# Altium schematic symbol library Resistor - Current Sense.SchLib: 810 symbols (part 2 of 4)
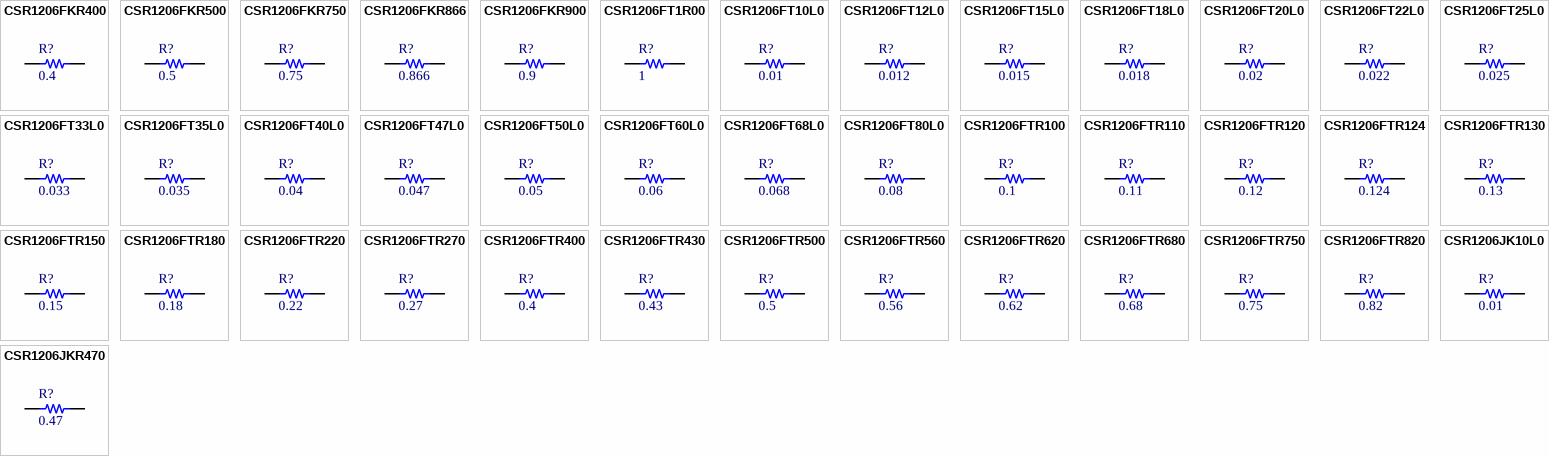
[diagram p21: symbols CSR1206FKR400 to CSR1206JKR470]

## CSR1206FTR500
designator R?, comment 0.5
RES SMD 0.5 OHM 1% 1/2W 1206; Part Number: CSR1206FTR500; Manufacturer: Stackpole Electronics Inc.; TemperatureRange: -55C ~ 155C; TemperatureCoefficient: 100ppm/C; PowerRating: 0.5W, 1/2W; Value: 0.5; PartId: 9976; Supplier 1: Digi-Key; Supplier Part Number 1: CSR1206FTR500TR-ND; ComponentLink1Description: Datasheet; ComponentLink1URL: http://www.seielect.com/catalog/SEI-CSR_CSRN.pdf; ComponentLink2Description: Digi-Key Listing; ComponentLink2URL: https://www.digikey.com/product-detail/en/stackpole-electronics-inc/CSR1206FTR500/CSR1206FTR500TR-ND/1742401; Tolerance: 1%; Price: 0.0427; Device Package: 1206 (3216 Metric)
footprint STACKPOLE CSR1206
pins: 1, 2

## CSR1206FTR560
designator R?, comment 0.56
RES SMD 0.56 OHM 1% 1/2W 1206; Part Number: CSR1206FTR560; Manufacturer: Stackpole Electronics Inc.; TemperatureRange: -55C ~ 155C; TemperatureCoefficient: 100ppm/C; PowerRating: 0.5W, 1/2W; Value: 0.56; PartId: 9979; Supplier 1: Digi-Key; Supplier Part Number 1: CSR1206FTR560-ND; ComponentLink1Description: Datasheet; ComponentLink1URL: http://www.seielect.com/catalog/SEI-CSR_CSRN.pdf; ComponentLink2Description: Digi-Key Listing; ComponentLink2URL: https://www.digikey.com/product-detail/en/stackpole-electronics-inc/CSR1206FTR560/CSR1206FTR560-ND/1742403; Tolerance: 1%; Price: 0.0427; Device Package: 1206 (3216 Metric)
footprint STACKPOLE CSR1206
pins: 1, 2

## CSR1206FTR620
designator R?, comment 0.62
RES SMD 0.62 OHM 1% 1/2W 1206; Part Number: CSR1206FTR620; Manufacturer: Stackpole Electronics Inc.; TemperatureRange: -55C ~ 155C; TemperatureCoefficient: 100ppm/C; PowerRating: 0.5W, 1/2W; Value: 0.62; PartId: 9980; Supplier 1: Digi-Key; Supplier Part Number 1: CSR1206FTR620-ND; ComponentLink1Description: Datasheet; ComponentLink1URL: http://www.seielect.com/catalog/SEI-CSR_CSRN.pdf; ComponentLink2Description: Digi-Key Listing; ComponentLink2URL: https://www.digikey.com/product-detail/en/stackpole-electronics-inc/CSR1206FTR620/CSR1206FTR620-ND/1742404; Tolerance: 1%; Price: 0.0427; Device Package: 1206 (3216 Metric)
footprint STACKPOLE CSR1206
pins: 1, 2

## CSR1206FTR680
designator R?, comment 0.68
RES SMD 0.68 OHM 1% 1/2W 1206; Part Number: CSR1206FTR680; Manufacturer: Stackpole Electronics Inc.; TemperatureRange: -55C ~ 155C; TemperatureCoefficient: 100ppm/C; PowerRating: 0.5W, 1/2W; Value: 0.68; PartId: 9981; Supplier 1: Digi-Key; Supplier Part Number 1: CSR1206FTR680-ND; ComponentLink1Description: Datasheet; ComponentLink1URL: http://www.seielect.com/catalog/SEI-CSR_CSRN.pdf; ComponentLink2Description: Digi-Key Listing; ComponentLink2URL: https://www.digikey.com/product-detail/en/stackpole-electronics-inc/CSR1206FTR680/CSR1206FTR680-ND/1742405; Tolerance: 1%; Price: 0.0427; Device Package: 1206 (3216 Metric)
footprint STACKPOLE CSR1206
pins: 1, 2

## CSR1206FTR750
designator R?, comment 0.75
RES SMD 0.75 OHM 1% 1/2W 1206; Part Number: CSR1206FTR750; Manufacturer: Stackpole Electronics Inc.; TemperatureRange: -55C ~ 155C; TemperatureCoefficient: 100ppm/C; PowerRating: 0.5W, 1/2W; Value: 0.75; PartId: 9983; Supplier 1: Digi-Key; Supplier Part Number 1: CSR1206FTR750-ND; ComponentLink1Description: Datasheet; ComponentLink1URL: http://www.seielect.com/catalog/SEI-CSR_CSRN.pdf; ComponentLink2Description: Digi-Key Listing; ComponentLink2URL: https://www.digikey.com/product-detail/en/stackpole-electronics-inc/CSR1206FTR750/CSR1206FTR750-ND/1742406; Tolerance: 1%; Price: 0.0427; Device Package: 1206 (3216 Metric)
footprint STACKPOLE CSR1206
pins: 1, 2

## CSR1206FTR820
designator R?, comment 0.82
RES SMD 0.82 OHM 1% 1/2W 1206; Part Number: CSR1206FTR820; Manufacturer: Stackpole Electronics Inc.; TemperatureRange: -55C ~ 155C; TemperatureCoefficient: 100ppm/C; PowerRating: 0.5W, 1/2W; Value: 0.82; PartId: 9984; Supplier 1: Digi-Key; Supplier Part Number 1: CSR1206FTR820TR-ND; ComponentLink1Description: Datasheet; ComponentLink1URL: http://www.seielect.com/catalog/SEI-CSR_CSRN.pdf; ComponentLink2Description: Digi-Key Listing; ComponentLink2URL: https://www.digikey.com/product-detail/en/stackpole-electronics-inc/CSR1206FTR820/CSR1206FTR820TR-ND/1742407; Tolerance: 1%; Price: 0.0427; Device Package: 1206 (3216 Metric)
footprint STACKPOLE CSR1206
pins: 1, 2

## CSR1206JK10L0
designator R?, comment 0.01
RES SMD 0.01 OHM 5% 1/2W 1206; Part Number: CSR1206JK10L0; Manufacturer: Stackpole Electronics Inc.; TemperatureRange: -55C ~ 155C; PowerRating: 0.5W, 1/2W; Value: 0.01; PartId: 9925; Supplier 1: Digi-Key; Supplier Part Number 1: CSR1206JK10L0-ND; ComponentLink1Description: Datasheet; ComponentLink1URL: http://www.seielect.com/catalog/SEI-CSR_CSRN.pdf; ComponentLink2Description: Digi-Key Listing; ComponentLink2URL: https://www.digikey.com/product-detail/en/stackpole-electronics-inc/CSR1206JK10L0/CSR1206JK10L0-ND/1742358; Tolerance: 5%; Price: 0.126; Device Package: 1206 (3216 Metric)
footprint STACKPOLE CSR1206
pins: 1, 2

## CSR1206JKR470
designator R?, comment 0.47
RES SMD 0.47 OHM 5% 1/2W 1206; Part Number: CSR1206JKR470; Manufacturer: Stackpole Electronics Inc.; TemperatureRange: -55C ~ 155C; TemperatureCoefficient: 100ppm/C; PowerRating: 0.5W, 1/2W; Value: 0.47; PartId: 9975; Supplier 1: Digi-Key; Supplier Part Number 1: CSR1206JKR470-ND; ComponentLink1Description: Datasheet; ComponentLink1URL: http://www.seielect.com/catalog/SEI-CSR_CSRN.pdf; ComponentLink2Description: Digi-Key Listing; ComponentLink2URL: https://www.digikey.com/product-detail/en/stackpole-electronics-inc/CSR1206JKR470/CSR1206JKR470-ND/1742400; Tolerance: 5%; Price: 0.051; Device Package: 1206 (3216 Metric)
footprint STACKPOLE CSR1206
pins: 1, 2

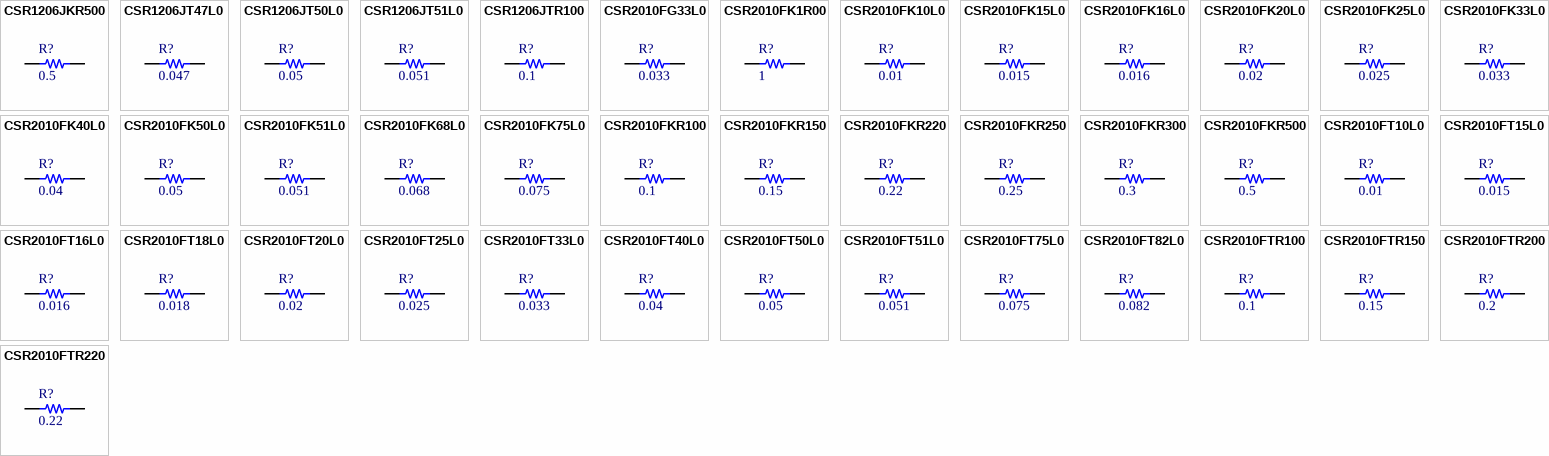
[diagram p5: symbols CSR1206JKR500 to CSR2010FTR220]

## CSR1206JKR500
designator R?, comment 0.5
RES SMD 0.5 OHM 5% 1/2W 1206; Part Number: CSR1206JKR500; Manufacturer: Stackpole Electronics Inc.; TemperatureRange: -55C ~ 155C; TemperatureCoefficient: 100ppm/C; PowerRating: 0.5W, 1/2W; Value: 0.5; PartId: 9978; Supplier 1: Digi-Key; Supplier Part Number 1: CSR1206JKR500-ND; ComponentLink1Description: Datasheet; ComponentLink1URL: http://www.seielect.com/catalog/SEI-CSR_CSRN.pdf; ComponentLink2Description: Digi-Key Listing; ComponentLink2URL: https://www.digikey.com/product-detail/en/stackpole-electronics-inc/CSR1206JKR500/CSR1206JKR500-ND/1742402; Tolerance: 5%; Price: 0.027; Device Package: 1206 (3216 Metric)
footprint STACKPOLE CSR1206
pins: 1, 2

## CSR1206JT47L0
designator R?, comment 0.047
RES SMD 0.047 OHM 5% 1/2W 1206; Part Number: CSR1206JT47L0; Manufacturer: Stackpole Electronics Inc.; TemperatureRange: -55C ~ 155C; PowerRating: 0.5W, 1/2W; Value: 0.047; PartId: 9942; Supplier 1: Digi-Key; Supplier Part Number 1: CSR1206JT47L0-ND; ComponentLink1Description: Datasheet; ComponentLink1URL: http://www.seielect.com/catalog/SEI-CSR_CSRN.pdf; ComponentLink2Description: Digi-Key Listing; ComponentLink2URL: https://www.digikey.com/product-detail/en/stackpole-electronics-inc/CSR1206JT47L0/CSR1206JT47L0-ND/1742371; Tolerance: 5%; Price: 0.0931; Device Package: 1206 (3216 Metric)
footprint STACKPOLE CSR1206
pins: 1, 2

## CSR1206JT50L0
designator R?, comment 0.05
RES SMD 0.05 OHM 5% 1/2W 1206; Part Number: CSR1206JT50L0; Manufacturer: Stackpole Electronics Inc.; TemperatureRange: -55C ~ 155C; TemperatureCoefficient: 100ppm/C; PowerRating: 0.5W, 1/2W; Value: 0.05; PartId: 9945; Supplier 1: Digi-Key; Supplier Part Number 1: CSR1206JT50L0-ND; ComponentLink1Description: Datasheet; ComponentLink1URL: http://www.seielect.com/catalog/SEI-CSR_CSRN.pdf; ComponentLink2Description: Digi-Key Listing; ComponentLink2URL: https://www.digikey.com/product-detail/en/stackpole-electronics-inc/CSR1206JT50L0/CSR1206JT50L0-ND/1742373; Tolerance: 5%; Price: 0.0931; Device Package: 1206 (3216 Metric)
footprint STACKPOLE CSR1206
pins: 1, 2

## CSR1206JT51L0
designator R?, comment 0.051
RES SMD 0.051 OHM 5% 1/2W 1206; Part Number: CSR1206JT51L0; Manufacturer: Stackpole Electronics Inc.; TemperatureRange: -55C ~ 155C; TemperatureCoefficient: 100ppm/C; PowerRating: 0.5W, 1/2W; Value: 0.051; PartId: 9946; Supplier 1: Digi-Key; Supplier Part Number 1: CSR1206JT51L0-ND; ComponentLink1Description: Datasheet; ComponentLink1URL: http://www.seielect.com/catalog/SEI-CSR_CSRN.pdf; ComponentLink2Description: Digi-Key Listing; ComponentLink2URL: https://www.digikey.com/product-detail/en/stackpole-electronics-inc/CSR1206JT51L0/CSR1206JT51L0-ND/1742374; Tolerance: 5%; Price: 0.081; Device Package: 1206 (3216 Metric)
footprint STACKPOLE CSR1206
pins: 1, 2

## CSR1206JTR100
designator R?, comment 0.1
RES SMD 0.1 OHM 5% 1/2W 1206; Part Number: CSR1206JTR100; Manufacturer: Stackpole Electronics Inc.; TemperatureRange: -55C ~ 155C; TemperatureCoefficient: 100ppm/C; PowerRating: 0.5W, 1/2W; Value: 0.1; PartId: 9954; Supplier 1: Digi-Key; Supplier Part Number 1: CSR1206JTR100-ND; ComponentLink1Description: Datasheet; ComponentLink1URL: http://www.seielect.com/catalog/SEI-CSR_CSRN.pdf; ComponentLink2Description: Digi-Key Listing; ComponentLink2URL: https://www.digikey.com/product-detail/en/stackpole-electronics-inc/CSR1206JTR100/CSR1206JTR100-ND/1742380; Tolerance: 5%; Price: 0.0427; Device Package: 1206 (3216 Metric)
footprint STACKPOLE CSR1206
pins: 1, 2

## CSR2010FG33L0
designator R?, comment 0.033
RES SMD 0.033 OHM 1% 1W 2010; Part Number: CSR2010FG33L0; Manufacturer: Stackpole Electronics Inc.; TemperatureRange: -55C ~ 155C; Value: 0.033; PartId: 10021; Supplier 1: Digi-Key; Supplier Part Number 1: CSR2010FG33L0TR-ND; ComponentLink1Description: Datasheet; ComponentLink1URL: http://www.seielect.com/catalog/SEI-CSR_CSRN.pdf; ComponentLink2Description: Digi-Key Listing; ComponentLink2URL: https://www.digikey.com/product-detail/en/stackpole-electronics-inc/CSR2010FG33L0/CSR2010FG33L0TR-ND/2027021; Tolerance: 1%; PowerRating: 1W; Price: 0.169; Device Package: 2010 (5025 Metric)
footprint STACKPOLE CSR2010
pins: 1, 2

## CSR2010FK1R00
designator R?, comment 1
RES SMD 1 OHM 1% 1W 2010; Part Number: CSR2010FK1R00; Manufacturer: Stackpole Electronics Inc.; TemperatureRange: -55C ~ 155C; TemperatureCoefficient: 100ppm/C; Value: 1; PartId: 9999; Supplier 1: Digi-Key; Supplier Part Number 1: CSR2010FK1R00-ND; ComponentLink1Description: Datasheet; ComponentLink1URL: http://www.seielect.com/catalog/SEI-CSR_CSRN.pdf; ComponentLink2Description: Digi-Key Listing; ComponentLink2URL: https://www.digikey.com/product-detail/en/stackpole-electronics-inc/CSR2010FK1R00/CSR2010FK1R00-ND/1742356; Tolerance: 1%; PowerRating: 1W; Price: 0.098; Device Package: 2010 (5025 Metric)
footprint STACKPOLE CSR2010
pins: 1, 2

## CSR2010FK10L0
designator R?, comment 0.01
RES SMD 0.01 OHM 1% 1W 2010; Part Number: CSR2010FK10L0; Manufacturer: Stackpole Electronics Inc.; TemperatureRange: -55C ~ 155C; Value: 0.01; PartId: 10035; Supplier 1: Digi-Key; Supplier Part Number 1: CSR2010FK10L0-ND; ComponentLink1Description: Datasheet; ComponentLink1URL: http://www.seielect.com/catalog/SEI-CSR_CSRN.pdf; ComponentLink2Description: Digi-Key Listing; ComponentLink2URL: https://www.digikey.com/product-detail/en/stackpole-electronics-inc/CSR2010FK10L0/CSR2010FK10L0-ND/1742310; Tolerance: 1%; PowerRating: 1W; Price: 0.1925; Device Package: 2010 (5025 Metric)
footprint STACKPOLE CSR2010
pins: 1, 2

## CSR2010FK15L0
designator R?, comment 0.015
RES SMD 0.015 OHM 1% 1W 2010; Part Number: CSR2010FK15L0; Manufacturer: Stackpole Electronics Inc.; TemperatureRange: -55C ~ 155C; Value: 0.015; PartId: 10036; Supplier 1: Digi-Key; Supplier Part Number 1: CSR2010FK15L0-ND; ComponentLink1Description: Datasheet; ComponentLink1URL: http://www.seielect.com/catalog/SEI-CSR_CSRN.pdf; ComponentLink2Description: Digi-Key Listing; ComponentLink2URL: https://www.digikey.com/product-detail/en/stackpole-electronics-inc/CSR2010FK15L0/CSR2010FK15L0-ND/1742313; Tolerance: 1%; PowerRating: 1W; Price: 0.1925; Device Package: 2010 (5025 Metric)
footprint STACKPOLE CSR2010
pins: 1, 2

## CSR2010FK16L0
designator R?, comment 0.016
RES SMD 0.016 OHM 1% 1W 2010; Part Number: CSR2010FK16L0; Manufacturer: Stackpole Electronics Inc.; TemperatureRange: -55C ~ 155C; Value: 0.016; PartId: 10037; Supplier 1: Digi-Key; Supplier Part Number 1: CSR2010FK16L0-ND; ComponentLink1Description: Datasheet; ComponentLink1URL: http://www.seielect.com/catalog/SEI-CSR_CSRN.pdf; ComponentLink2Description: Digi-Key Listing; ComponentLink2URL: https://www.digikey.com/product-detail/en/stackpole-electronics-inc/CSR2010FK16L0/CSR2010FK16L0-ND/1742315; Tolerance: 1%; PowerRating: 1W; Price: 0.1925; Device Package: 2010 (5025 Metric)
footprint STACKPOLE CSR2010
pins: 1, 2

## CSR2010FK20L0
designator R?, comment 0.02
RES SMD 0.02 OHM 1% 1W 2010; Part Number: CSR2010FK20L0; Manufacturer: Stackpole Electronics Inc.; TemperatureRange: -55C ~ 155C; Value: 0.02; PartId: 10038; Supplier 1: Digi-Key; Supplier Part Number 1: CSR2010FK20L0-ND; ComponentLink1Description: Datasheet; ComponentLink1URL: http://www.seielect.com/catalog/SEI-CSR_CSRN.pdf; ComponentLink2Description: Digi-Key Listing; ComponentLink2URL: https://www.digikey.com/product-detail/en/stackpole-electronics-inc/CSR2010FK20L0/CSR2010FK20L0-ND/1742318; Tolerance: 1%; PowerRating: 1W; Price: 0.1925; Device Package: 2010 (5025 Metric)
footprint STACKPOLE CSR2010
pins: 1, 2

## CSR2010FK25L0
designator R?, comment 0.025
RES SMD 0.025 OHM 1% 1W 2010; Part Number: CSR2010FK25L0; Manufacturer: Stackpole Electronics Inc.; TemperatureRange: -55C ~ 155C; Value: 0.025; PartId: 10027; Supplier 1: Digi-Key; Supplier Part Number 1: CSR2010FK25L0-ND; ComponentLink1Description: Datasheet; ComponentLink1URL: http://www.seielect.com/catalog/SEI-CSR_CSRN.pdf; ComponentLink2Description: Digi-Key Listing; ComponentLink2URL: https://www.digikey.com/product-detail/en/stackpole-electronics-inc/CSR2010FK25L0/CSR2010FK25L0-ND/1742320; Tolerance: 1%; PowerRating: 1W; Price: 0.1787; Device Package: 2010 (5025 Metric)
footprint STACKPOLE CSR2010
pins: 1, 2

## CSR2010FK33L0
designator R?, comment 0.033
RES SMD 0.033 OHM 1% 1W 2010; Part Number: CSR2010FK33L0; Manufacturer: Stackpole Electronics Inc.; TemperatureRange: -55C ~ 155C; Value: 0.033; PartId: 10028; Supplier 1: Digi-Key; Supplier Part Number 1: CSR2010FK33L0-ND; ComponentLink1Description: Datasheet; ComponentLink1URL: http://www.seielect.com/catalog/SEI-CSR_CSRN.pdf; ComponentLink2Description: Digi-Key Listing; ComponentLink2URL: https://www.digikey.com/product-detail/en/stackpole-electronics-inc/CSR2010FK33L0/CSR2010FK33L0-ND/1742324; Tolerance: 1%; PowerRating: 1W; Price: 0.1787; Device Package: 2010 (5025 Metric)
footprint STACKPOLE CSR2010
pins: 1, 2

## CSR2010FK40L0
designator R?, comment 0.04
RES SMD 0.04 OHM 1% 1W 2010; Part Number: CSR2010FK40L0; Manufacturer: Stackpole Electronics Inc.; TemperatureRange: -55C ~ 155C; Value: 0.04; PartId: 10029; Supplier 1: Digi-Key; Supplier Part Number 1: CSR2010FK40L0-ND; ComponentLink1Description: Datasheet; ComponentLink1URL: http://www.seielect.com/catalog/SEI-CSR_CSRN.pdf; ComponentLink2Description: Digi-Key Listing; ComponentLink2URL: https://www.digikey.com/product-detail/en/stackpole-electronics-inc/CSR2010FK40L0/CSR2010FK40L0-ND/1742326; Tolerance: 1%; PowerRating: 1W; Price: 0.1787; Device Package: 2010 (5025 Metric)
footprint STACKPOLE CSR2010
pins: 1, 2

## CSR2010FK50L0
designator R?, comment 0.05
RES SMD 0.05 OHM 1% 1W 2010; Part Number: CSR2010FK50L0; Manufacturer: Stackpole Electronics Inc.; TemperatureRange: -55C ~ 155C; TemperatureCoefficient: 100ppm/C; Value: 0.05; PartId: 10030; Supplier 1: Digi-Key; Supplier Part Number 1: CSR2010FK50L0-ND; ComponentLink1Description: Datasheet; ComponentLink1URL: http://www.seielect.com/catalog/SEI-CSR_CSRN.pdf; ComponentLink2Description: Digi-Key Listing; ComponentLink2URL: https://www.digikey.com/product-detail/en/stackpole-electronics-inc/CSR2010FK50L0/CSR2010FK50L0-ND/1742328; Tolerance: 1%; PowerRating: 1W; Price: 0.1787; Device Package: 2010 (5025 Metric)
footprint STACKPOLE CSR2010
pins: 1, 2

## CSR2010FK51L0
designator R?, comment 0.051
RES SMD 0.051 OHM 1% 1W 2010; Part Number: CSR2010FK51L0; Manufacturer: Stackpole Electronics Inc.; TemperatureRange: -55C ~ 155C; TemperatureCoefficient: 100ppm/C; Value: 0.051; PartId: 10017; Supplier 1: Digi-Key; Supplier Part Number 1: CSR2010FK51L0-ND; ComponentLink1Description: Datasheet; ComponentLink1URL: http://www.seielect.com/catalog/SEI-CSR_CSRN.pdf; ComponentLink2Description: Digi-Key Listing; ComponentLink2URL: https://www.digikey.com/product-detail/en/stackpole-electronics-inc/CSR2010FK51L0/CSR2010FK51L0-ND/1742330; Tolerance: 1%; PowerRating: 1W; Price: 0.1526; Device Package: 2010 (5025 Metric)
footprint STACKPOLE CSR2010
pins: 1, 2

## CSR2010FK68L0
designator R?, comment 0.068
RES SMD 0.068 OHM 1% 1W 2010; Part Number: CSR2010FK68L0; Manufacturer: Stackpole Electronics Inc.; TemperatureRange: -55C ~ 155C; TemperatureCoefficient: 100ppm/C; Value: 0.068; PartId: 10018; Supplier 1: Digi-Key; Supplier Part Number 1: CSR2010FK68L0-ND; ComponentLink1Description: Datasheet; ComponentLink1URL: http://www.seielect.com/catalog/SEI-CSR_CSRN.pdf; ComponentLink2Description: Digi-Key Listing; ComponentLink2URL: https://www.digikey.com/product-detail/en/stackpole-electronics-inc/CSR2010FK68L0/CSR2010FK68L0-ND/1742332; Tolerance: 1%; PowerRating: 1W; Price: 0.1526; Device Package: 2010 (5025 Metric)
footprint STACKPOLE CSR2010
pins: 1, 2

## CSR2010FK75L0
designator R?, comment 0.075
RES SMD 0.075 OHM 1% 1W 2010; Part Number: CSR2010FK75L0; Manufacturer: Stackpole Electronics Inc.; TemperatureRange: -55C ~ 155C; TemperatureCoefficient: 100ppm/C; Value: 0.075; PartId: 10019; Supplier 1: Digi-Key; Supplier Part Number 1: CSR2010FK75L0-ND; ComponentLink1Description: Datasheet; ComponentLink1URL: http://www.seielect.com/catalog/SEI-CSR_CSRN.pdf; ComponentLink2Description: Digi-Key Listing; ComponentLink2URL: https://www.digikey.com/product-detail/en/stackpole-electronics-inc/CSR2010FK75L0/CSR2010FK75L0-ND/1742333; Tolerance: 1%; PowerRating: 1W; Price: 0.1526; Device Package: 2010 (5025 Metric)
footprint STACKPOLE CSR2010
pins: 1, 2

## CSR2010FKR100
designator R?, comment 0.1
RES SMD 0.1 OHM 1% 1W 2010; Part Number: CSR2010FKR100; Manufacturer: Stackpole Electronics Inc.; TemperatureRange: -55C ~ 155C; TemperatureCoefficient: 100ppm/C; Value: 0.1; PartId: 10020; Supplier 1: Digi-Key; Supplier Part Number 1: CSR2010FKR100-ND; ComponentLink1Description: Datasheet; ComponentLink1URL: http://www.seielect.com/catalog/SEI-CSR_CSRN.pdf; ComponentLink2Description: Digi-Key Listing; ComponentLink2URL: https://www.digikey.com/product-detail/en/stackpole-electronics-inc/CSR2010FKR100/CSR2010FKR100-ND/1742336; Tolerance: 1%; PowerRating: 1W; Price: 0.1526; Device Package: 2010 (5025 Metric)
footprint STACKPOLE CSR2010
pins: 1, 2

## CSR2010FKR150
designator R?, comment 0.15
RES SMD 0.15 OHM 1% 1W 2010; Part Number: CSR2010FKR150; Manufacturer: Stackpole Electronics Inc.; TemperatureRange: -55C ~ 155C; TemperatureCoefficient: 100ppm/C; Value: 0.15; PartId: 10008; Supplier 1: Digi-Key; Supplier Part Number 1: CSR2010FKR150-ND; ComponentLink1Description: Datasheet; ComponentLink1URL: http://www.seielect.com/catalog/SEI-CSR_CSRN.pdf; ComponentLink2Description: Digi-Key Listing; ComponentLink2URL: https://www.digikey.com/product-detail/en/stackpole-electronics-inc/CSR2010FKR150/CSR2010FKR150-ND/1742338; Tolerance: 1%; PowerRating: 1W; Price: 0.126; Device Package: 2010 (5025 Metric)
footprint STACKPOLE CSR2010
pins: 1, 2

## CSR2010FKR220
designator R?, comment 0.22
RES SMD 0.22 OHM 1% 1W 2010; Part Number: CSR2010FKR220; Manufacturer: Stackpole Electronics Inc.; TemperatureRange: -55C ~ 155C; TemperatureCoefficient: 100ppm/C; Value: 0.22; PartId: 10009; Supplier 1: Digi-Key; Supplier Part Number 1: CSR2010FKR220-ND; ComponentLink1Description: Datasheet; ComponentLink1URL: http://www.seielect.com/catalog/SEI-CSR_CSRN.pdf; ComponentLink2Description: Digi-Key Listing; ComponentLink2URL: https://www.digikey.com/product-detail/en/stackpole-electronics-inc/CSR2010FKR220/CSR2010FKR220-ND/1742342; Tolerance: 1%; PowerRating: 1W; Price: 0.126; Device Package: 2010 (5025 Metric)
footprint STACKPOLE CSR2010
pins: 1, 2

## CSR2010FKR250
designator R?, comment 0.25
RES SMD 0.25 OHM 1% 1W 2010; Part Number: CSR2010FKR250; Manufacturer: Stackpole Electronics Inc.; TemperatureRange: -55C ~ 155C; TemperatureCoefficient: 100ppm/C; Value: 0.25; PartId: 10010; Supplier 1: Digi-Key; Supplier Part Number 1: CSR2010FKR250-ND; ComponentLink1Description: Datasheet; ComponentLink1URL: http://www.seielect.com/catalog/SEI-CSR_CSRN.pdf; ComponentLink2Description: Digi-Key Listing; ComponentLink2URL: https://www.digikey.com/product-detail/en/stackpole-electronics-inc/CSR2010FKR250/CSR2010FKR250-ND/1742344; Tolerance: 1%; PowerRating: 1W; Price: 0.126; Device Package: 2010 (5025 Metric)
footprint STACKPOLE CSR2010
pins: 1, 2

## CSR2010FKR300
designator R?, comment 0.3
RES SMD 0.3 OHM 1% 1W 2010; Part Number: CSR2010FKR300; Manufacturer: Stackpole Electronics Inc.; TemperatureRange: -55C ~ 155C; TemperatureCoefficient: 100ppm/C; Value: 0.3; PartId: 10011; Supplier 1: Digi-Key; Supplier Part Number 1: CSR2010FKR300-ND; ComponentLink1Description: Datasheet; ComponentLink1URL: http://www.seielect.com/catalog/SEI-CSR_CSRN.pdf; ComponentLink2Description: Digi-Key Listing; ComponentLink2URL: https://www.digikey.com/product-detail/en/stackpole-electronics-inc/CSR2010FKR300/CSR2010FKR300-ND/1742346; Tolerance: 1%; PowerRating: 1W; Price: 0.126; Device Package: 2010 (5025 Metric)
footprint STACKPOLE CSR2010
pins: 1, 2

## CSR2010FKR500
designator R?, comment 0.5
RES SMD 0.5 OHM 1% 1W 2010; Part Number: CSR2010FKR500; Manufacturer: Stackpole Electronics Inc.; TemperatureRange: -55C ~ 155C; TemperatureCoefficient: 100ppm/C; Value: 0.5; PartId: 9998; Supplier 1: Digi-Key; Supplier Part Number 1: CSR2010FKR500-ND; ComponentLink1Description: Datasheet; ComponentLink1URL: http://www.seielect.com/catalog/SEI-CSR_CSRN.pdf; ComponentLink2Description: Digi-Key Listing; ComponentLink2URL: https://www.digikey.com/product-detail/en/stackpole-electronics-inc/CSR2010FKR500/CSR2010FKR500-ND/1742354; Tolerance: 1%; PowerRating: 1W; Price: 0.098; Device Package: 2010 (5025 Metric)
footprint STACKPOLE CSR2010
pins: 1, 2

## CSR2010FT10L0
designator R?, comment 0.01
RES SMD 0.01 OHM 1% 1W 2010; Part Number: CSR2010FT10L0; Manufacturer: Stackpole Electronics Inc.; TemperatureRange: -55C ~ 155C; Value: 0.01; PartId: 10034; Supplier 1: Digi-Key; Supplier Part Number 1: CSR2010FT10L0TR-ND; ComponentLink1Description: Datasheet; ComponentLink1URL: http://www.seielect.com/catalog/SEI-CSR_CSRN.pdf; ComponentLink2Description: Digi-Key Listing; ComponentLink2URL: https://www.digikey.com/product-detail/en/stackpole-electronics-inc/CSR2010FT10L0/CSR2010FT10L0TR-ND/2027020; Tolerance: 1%; PowerRating: 1W; Price: 0.1862; Device Package: 2010 (5025 Metric)
footprint STACKPOLE CSR2010
pins: 1, 2

## CSR2010FT15L0
designator R?, comment 0.015
RES SMD 0.015 OHM 1% 1W 2010; Part Number: CSR2010FT15L0; Manufacturer: Stackpole Electronics Inc.; TemperatureRange: -55C ~ 155C; Value: 0.015; PartId: 10031; Supplier 1: Digi-Key; Supplier Part Number 1: CSR2010FT15L0-ND; ComponentLink1Description: Datasheet; ComponentLink1URL: http://www.seielect.com/catalog/SEI-CSR_CSRN.pdf; ComponentLink2Description: Digi-Key Listing; ComponentLink2URL: https://www.digikey.com/product-detail/en/stackpole-electronics-inc/CSR2010FT15L0/CSR2010FT15L0-ND/1742314; Tolerance: 1%; PowerRating: 1W; Price: 0.1862; Device Package: 2010 (5025 Metric)
footprint STACKPOLE CSR2010
pins: 1, 2

## CSR2010FT16L0
designator R?, comment 0.016
RES SMD 0.016 OHM 1% 1W 2010; Part Number: CSR2010FT16L0; Manufacturer: Stackpole Electronics Inc.; TemperatureRange: -55C ~ 155C; Value: 0.016; PartId: 10032; Supplier 1: Digi-Key; Supplier Part Number 1: CSR2010FT16L0-ND; ComponentLink1Description: Datasheet; ComponentLink1URL: http://www.seielect.com/catalog/SEI-CSR_CSRN.pdf; ComponentLink2Description: Digi-Key Listing; ComponentLink2URL: https://www.digikey.com/product-detail/en/stackpole-electronics-inc/CSR2010FT16L0/CSR2010FT16L0-ND/1742316; Tolerance: 1%; PowerRating: 1W; Price: 0.1862; Device Package: 2010 (5025 Metric)
footprint STACKPOLE CSR2010
pins: 1, 2

## CSR2010FT18L0
designator R?, comment 0.018
RES SMD 0.018 OHM 1% 1W 2010; Part Number: CSR2010FT18L0; Manufacturer: Stackpole Electronics Inc.; TemperatureRange: -55C ~ 155C; Value: 0.018; PartId: 10033; Supplier 1: Digi-Key; Supplier Part Number 1: CSR2010FT18L0-ND; ComponentLink1Description: Datasheet; ComponentLink1URL: http://www.seielect.com/catalog/SEI-CSR_CSRN.pdf; ComponentLink2Description: Digi-Key Listing; ComponentLink2URL: https://www.digikey.com/product-detail/en/stackpole-electronics-inc/CSR2010FT18L0/CSR2010FT18L0-ND/1742317; Tolerance: 1%; PowerRating: 1W; Price: 0.1862; Device Package: 2010 (5025 Metric)
footprint STACKPOLE CSR2010
pins: 1, 2

## CSR2010FT20L0
designator R?, comment 0.02
RES SMD 0.02 OHM 1% 1W 2010; Part Number: CSR2010FT20L0; Manufacturer: Stackpole Electronics Inc.; TemperatureRange: -55C ~ 155C; Value: 0.02; PartId: 10022; Supplier 1: Digi-Key; Supplier Part Number 1: CSR2010FT20L0-ND; ComponentLink1Description: Datasheet; ComponentLink1URL: http://www.seielect.com/catalog/SEI-CSR_CSRN.pdf; ComponentLink2Description: Digi-Key Listing; ComponentLink2URL: https://www.digikey.com/product-detail/en/stackpole-electronics-inc/CSR2010FT20L0/CSR2010FT20L0-ND/1742319; Tolerance: 1%; PowerRating: 1W; Price: 0.1729; Device Package: 2010 (5025 Metric)
footprint STACKPOLE CSR2010
pins: 1, 2

## CSR2010FT25L0
designator R?, comment 0.025
RES SMD 0.025 OHM 1% 1W 2010; Part Number: CSR2010FT25L0; Manufacturer: Stackpole Electronics Inc.; TemperatureRange: -55C ~ 155C; Value: 0.025; PartId: 10023; Supplier 1: Digi-Key; Supplier Part Number 1: CSR2010FT25L0-ND; ComponentLink1Description: Datasheet; ComponentLink1URL: http://www.seielect.com/catalog/SEI-CSR_CSRN.pdf; ComponentLink2Description: Digi-Key Listing; ComponentLink2URL: https://www.digikey.com/product-detail/en/stackpole-electronics-inc/CSR2010FT25L0/CSR2010FT25L0-ND/1742321; Tolerance: 1%; PowerRating: 1W; Price: 0.1729; Device Package: 2010 (5025 Metric)
footprint STACKPOLE CSR2010
pins: 1, 2

## CSR2010FT33L0
designator R?, comment 0.033
RES SMD 0.033 OHM 1% 1W 2010; Part Number: CSR2010FT33L0; Manufacturer: Stackpole Electronics Inc.; TemperatureRange: -55C ~ 155C; Value: 0.033; PartId: 10024; Supplier 1: Digi-Key; Supplier Part Number 1: CSR2010FT33L0-ND; ComponentLink1Description: Datasheet; ComponentLink1URL: http://www.seielect.com/catalog/SEI-CSR_CSRN.pdf; ComponentLink2Description: Digi-Key Listing; ComponentLink2URL: https://www.digikey.com/product-detail/en/stackpole-electronics-inc/CSR2010FT33L0/CSR2010FT33L0-ND/1742325; Tolerance: 1%; PowerRating: 1W; Price: 0.1729; Device Package: 2010 (5025 Metric)
footprint STACKPOLE CSR2010
pins: 1, 2

## CSR2010FT40L0
designator R?, comment 0.04
RES SMD 0.04 OHM 1% 1W 2010; Part Number: CSR2010FT40L0; Manufacturer: Stackpole Electronics Inc.; TemperatureRange: -55C ~ 155C; Value: 0.04; PartId: 10025; Supplier 1: Digi-Key; Supplier Part Number 1: CSR2010FT40L0-ND; ComponentLink1Description: Datasheet; ComponentLink1URL: http://www.seielect.com/catalog/SEI-CSR_CSRN.pdf; ComponentLink2Description: Digi-Key Listing; ComponentLink2URL: https://www.digikey.com/product-detail/en/stackpole-electronics-inc/CSR2010FT40L0/CSR2010FT40L0-ND/1742327; Tolerance: 1%; PowerRating: 1W; Price: 0.1729; Device Package: 2010 (5025 Metric)
footprint STACKPOLE CSR2010
pins: 1, 2

## CSR2010FT50L0
designator R?, comment 0.05
RES SMD 0.05 OHM 1% 1W 2010; Part Number: CSR2010FT50L0; Manufacturer: Stackpole Electronics Inc.; TemperatureRange: -55C ~ 155C; TemperatureCoefficient: 100ppm/C; Value: 0.05; PartId: 10026; Supplier 1: Digi-Key; Supplier Part Number 1: CSR2010FT50L0-ND; ComponentLink1Description: Datasheet; ComponentLink1URL: http://www.seielect.com/catalog/SEI-CSR_CSRN.pdf; ComponentLink2Description: Digi-Key Listing; ComponentLink2URL: https://www.digikey.com/product-detail/en/stackpole-electronics-inc/CSR2010FT50L0/CSR2010FT50L0-ND/1742329; Tolerance: 1%; PowerRating: 1W; Price: 0.1729; Device Package: 2010 (5025 Metric)
footprint STACKPOLE CSR2010
pins: 1, 2

## CSR2010FT51L0
designator R?, comment 0.051
RES SMD 0.051 OHM 1% 1W 2010; Part Number: CSR2010FT51L0; Manufacturer: Stackpole Electronics Inc.; TemperatureRange: -55C ~ 155C; TemperatureCoefficient: 100ppm/C; Value: 0.051; PartId: 10013; Supplier 1: Digi-Key; Supplier Part Number 1: CSR2010FT51L0-ND; ComponentLink1Description: Datasheet; ComponentLink1URL: http://www.seielect.com/catalog/SEI-CSR_CSRN.pdf; ComponentLink2Description: Digi-Key Listing; ComponentLink2URL: https://www.digikey.com/product-detail/en/stackpole-electronics-inc/CSR2010FT51L0/CSR2010FT51L0-ND/1742331; Tolerance: 1%; PowerRating: 1W; Price: 0.1474; Device Package: 2010 (5025 Metric)
footprint STACKPOLE CSR2010
pins: 1, 2

## CSR2010FT75L0
designator R?, comment 0.075
RES SMD 0.075 OHM 1% 1W 2010; Part Number: CSR2010FT75L0; Manufacturer: Stackpole Electronics Inc.; TemperatureRange: -55C ~ 155C; TemperatureCoefficient: 100ppm/C; Value: 0.075; PartId: 10014; Supplier 1: Digi-Key; Supplier Part Number 1: CSR2010FT75L0-ND; ComponentLink1Description: Datasheet; ComponentLink1URL: http://www.seielect.com/catalog/SEI-CSR_CSRN.pdf; ComponentLink2Description: Digi-Key Listing; ComponentLink2URL: https://www.digikey.com/product-detail/en/stackpole-electronics-inc/CSR2010FT75L0/CSR2010FT75L0-ND/1742334; Tolerance: 1%; PowerRating: 1W; Price: 0.1474; Device Package: 2010 (5025 Metric)
footprint STACKPOLE CSR2010
pins: 1, 2

## CSR2010FT82L0
designator R?, comment 0.082
RES SMD 0.082 OHM 1% 1W 2010; Part Number: CSR2010FT82L0; Manufacturer: Stackpole Electronics Inc.; TemperatureRange: -55C ~ 155C; TemperatureCoefficient: 100ppm/C; Value: 0.082; PartId: 10015; Supplier 1: Digi-Key; Supplier Part Number 1: CSR2010FT82L0-ND; ComponentLink1Description: Datasheet; ComponentLink1URL: http://www.seielect.com/catalog/SEI-CSR_CSRN.pdf; ComponentLink2Description: Digi-Key Listing; ComponentLink2URL: https://www.digikey.com/product-detail/en/stackpole-electronics-inc/CSR2010FT82L0/CSR2010FT82L0-ND/1742335; Tolerance: 1%; PowerRating: 1W; Price: 0.1474; Device Package: 2010 (5025 Metric)
footprint STACKPOLE CSR2010
pins: 1, 2

## CSR2010FTR100
designator R?, comment 0.1
RES SMD 0.1 OHM 1% 1W 2010; Part Number: CSR2010FTR100; Manufacturer: Stackpole Electronics Inc.; TemperatureRange: -55C ~ 155C; TemperatureCoefficient: 100ppm/C; Value: 0.1; PartId: 10016; Supplier 1: Digi-Key; Supplier Part Number 1: CSR2010FTR100-ND; ComponentLink1Description: Datasheet; ComponentLink1URL: http://www.seielect.com/catalog/SEI-CSR_CSRN.pdf; ComponentLink2Description: Digi-Key Listing; ComponentLink2URL: https://www.digikey.com/product-detail/en/stackpole-electronics-inc/CSR2010FTR100/CSR2010FTR100-ND/1742337; Tolerance: 1%; PowerRating: 1W; Price: 0.1474; Device Package: 2010 (5025 Metric)
footprint STACKPOLE CSR2010
pins: 1, 2

## CSR2010FTR150
designator R?, comment 0.15
RES SMD 0.15 OHM 1% 1W 2010; Part Number: CSR2010FTR150; Manufacturer: Stackpole Electronics Inc.; TemperatureRange: -55C ~ 155C; TemperatureCoefficient: 100ppm/C; Value: 0.15; PartId: 9990; Supplier 1: Digi-Key; Supplier Part Number 1: CSR2010FTR150TR-ND; ComponentLink1Description: Datasheet; ComponentLink1URL: http://www.seielect.com/catalog/SEI-CSR_CSRN.pdf; ComponentLink2Description: Digi-Key Listing; ComponentLink2URL: https://www.digikey.com/product-detail/en/stackpole-electronics-inc/CSR2010FTR150/CSR2010FTR150TR-ND/2026994; Tolerance: 1%; PowerRating: 1W; Price: 0.1215; Device Package: 2010 (5025 Metric)
footprint STACKPOLE CSR2010
pins: 1, 2

## CSR2010FTR200
designator R?, comment 0.2
RES SMD 0.2 OHM 1% 1W 2010; Part Number: CSR2010FTR200; Manufacturer: Stackpole Electronics Inc.; TemperatureRange: -55C ~ 155C; TemperatureCoefficient: 100ppm/C; Value: 0.2; PartId: 10001; Supplier 1: Digi-Key; Supplier Part Number 1: CSR2010FTR200-ND; ComponentLink1Description: Datasheet; ComponentLink1URL: http://www.seielect.com/catalog/SEI-CSR_CSRN.pdf; ComponentLink2Description: Digi-Key Listing; ComponentLink2URL: https://www.digikey.com/product-detail/en/stackpole-electronics-inc/CSR2010FTR200/CSR2010FTR200-ND/1742341; Tolerance: 1%; PowerRating: 1W; Price: 0.1215; Device Package: 2010 (5025 Metric)
footprint STACKPOLE CSR2010
pins: 1, 2

## CSR2010FTR220
designator R?, comment 0.22
RES SMD 0.22 OHM 1% 1W 2010; Part Number: CSR2010FTR220; Manufacturer: Stackpole Electronics Inc.; TemperatureRange: -55C ~ 155C; TemperatureCoefficient: 100ppm/C; Value: 0.22; PartId: 10002; Supplier 1: Digi-Key; Supplier Part Number 1: CSR2010FTR220-ND; ComponentLink1Description: Datasheet; ComponentLink1URL: http://www.seielect.com/catalog/SEI-CSR_CSRN.pdf; ComponentLink2Description: Digi-Key Listing; ComponentLink2URL: https://www.digikey.com/product-detail/en/stackpole-electronics-inc/CSR2010FTR220/CSR2010FTR220-ND/1742343; Tolerance: 1%; PowerRating: 1W; Price: 0.1215; Device Package: 2010 (5025 Metric)
footprint STACKPOLE CSR2010
pins: 1, 2
